# Altium footprint library разъёмы.PcbLib: 129 footprints (part 6 of 9)
Each footprint in its own frame and in the unit in brackets; x right, y up, seen from the top. Pads: shape width x height; smd on the part's side, far side on the other; paste and mask are expansions set on the pad; w line width, h text height; cw(c..) or ccw(c..) is an arc to the next point about the centre after c.
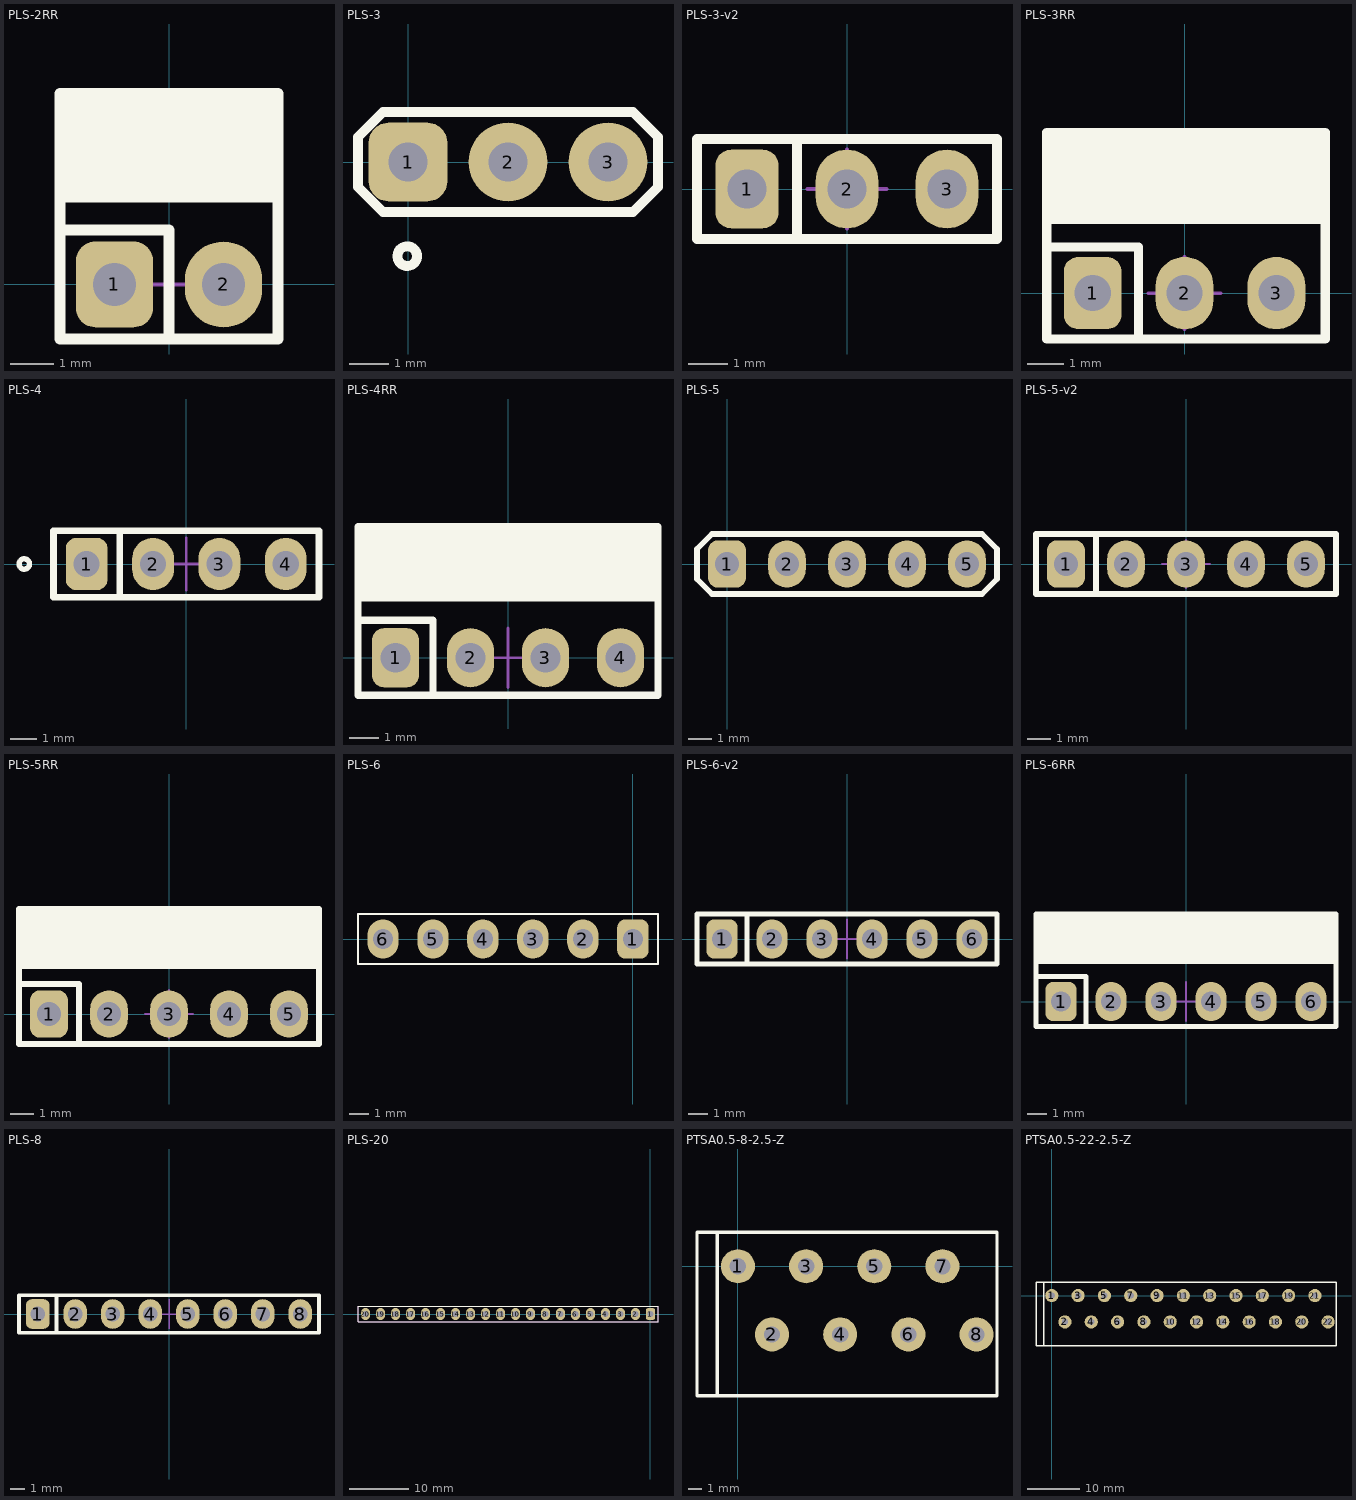
[diagram p5: the footprints below, top view; thin cyan lines are the x and y axes]

## PLS-2RR [mm]
height 10
pads (2):
  rrect50% 1.8x2 hole 1: 1(-1.27,0)
  oval 1.8x2 hole 1: 2(1.27,0)
Top Overlay:
  region: 2.54,1.905 2.54,4.445 -2.54,4.445 -2.54,1.905
  lines w0.25: -2.54,1.27 0,1.27 0,-1.27 ; -2.54,-1.27 -2.54,4.445 2.54,4.445 2.54,-1.27 -2.54,-1.27
Mechanical 15:
  lines w0.1: -1,0 1,0 ; 0,-1 0,1 ; -2.54,-1.27 2.54,-1.27 2.54,4.445 -2.54,4.445 -2.54,-1.27
3D body "User Library-Header_Male_RA_Low_2Pin.STEP": height 3.01, standoff -2.5, extent -2.54,-0.32 2.54,9.81

## PLS-3 [mm]
pads (3):
  rrect50% 2x2 hole 1: 1(0,0)
  round 2 hole 1: 2(2.54,0) 3(5.08,0)
Top Overlay:
  circle w0.25: c-0.02,-2.39 r0.25
  lines w0.254: -1.27,-0.635 -1.27,0.635 -0.635,1.27 5.715,1.27 6.35,0.635 6.35,-0.635 5.715,-1.27 -0.635,-1.27 -1.27,-0.635

## PLS-3-v2 [mm]
height 10
pads (3):
  rrect50% 1.6x2 hole 1: 1(-2.54,0)
  oval 1.6x2 hole 1: 2(0,0) 3(2.54,0)
Top Overlay:
  lines w0.25: -1.27,-1.27 -1.27,1.27 ; -3.81,-1.27 -3.81,1.27 3.81,1.27 3.81,-1.27 -3.81,-1.27
Mechanical 13:
  lines w0.1: -1.27,-1.27 -1.27,1.27 ; -3.81,-1.27 3.81,-1.27 3.81,1.27 -3.81,1.27 -3.81,-1.27
Mechanical 15:
  lines w0.1: -1,0 1,0 ; 0,-1 0,1 ; -3.81,-1.27 -3.81,1.27 3.81,1.27 3.81,-1.27 -3.81,-1.27
3D body "PLS-3.STEP": height 8.9, standoff -2.9, extent -3.81,-1.27 3.81,1.27

## PLS-3RR [mm]
height 10
pads (3):
  rrect50% 1.6x2 hole 1: 1(-2.54,0)
  oval 1.6x2 hole 1: 2(0,0) 3(2.54,0)
Top Overlay:
  region: 3.89,1.905 3.89,4.445 -3.81,4.445 -3.81,1.905
  lines w0.25: -3.81,1.27 -1.27,1.27 -1.27,-1.27 ; -3.81,-1.27 -3.81,4.445 3.89,4.445 3.89,-1.27 -3.81,-1.27
Mechanical 15:
  lines w0.1: -1,0 1,0 ; 0,-1 0,1 ; -3.81,-1.27 3.89,-1.27 3.89,4.445 -3.81,4.445 -3.81,-1.27
3D body "User Library-Header_Male_RA_Low_3Pin.STEP": height 3.01, standoff -2.5, extent -3.81,-0.32 3.81,9.81

## PLS-4 [mm]
height 10
pads (4):
  rrect50% 1.6x2 hole 1: 1(-3.81,0)
  oval 1.6x2 hole 1: 2(-1.27,0) 3(1.27,0) 4(3.81,0)
Top Overlay:
  circle w0.2: c-6.2,0 r0.2
  lines w0.25: -2.54,-1.27 -2.54,1.27 ; -5.08,-1.27 -5.08,1.27 5.08,1.27 5.08,-1.27 -5.08,-1.27
Mechanical 13:
  lines w0.1: -2.54,-1.27 -2.54,1.27 ; -5.08,-1.27 5.08,-1.27 5.08,1.27 -5.08,1.27 -5.08,-1.27
Mechanical 15:
  lines w0.1: -1,0 1,0 ; 0,-1 0,1 ; -5.08,-1.27 -5.08,1.27 5.08,1.27 5.08,-1.27 -5.08,-1.27
3D body "PLS-4.STEP": height 8.9, standoff -2.9, extent -5.08,-1.27 5.08,1.27

## PLS-4RR [mm]
height 10
pads (4):
  rrect50% 1.6x2 hole 1: 1(-3.81,0)
  oval 1.6x2 hole 1: 2(-1.27,0) 3(1.27,0) 4(3.81,0)
Top Overlay:
  region: 5.08,1.905 5.08,4.445 -5.08,4.445 -5.08,1.905
  lines w0.25: -5.08,1.27 -2.54,1.27 -2.54,-1.27 ; -5.08,-1.27 5.08,-1.27 5.08,4.445 -5.08,4.445 -5.08,-1.27
Mechanical 15:
  lines w0.1: -1,0 1,0 ; 0,-1 0,1 ; -5.08,-1.27 -5.08,4.445 5.08,4.445 5.08,-1.27 -5.08,-1.27
3D body "User Library-Header_Male_RA_Low_4Pin.STEP": height 3.01, standoff -2.5, extent -5.08,-0.32 5.08,9.81

## PLS-5 [mm]
pads (5):
  rrect50% 1.6x2 hole 1: 1(0,0)
  oval 1.6x2 hole 1: 2(2.54,0) 3(5.08,0) 4(7.62,0) 5(10.16,0)
Top Overlay:
  lines w0.254: -1.27,-0.635 -0.635,-1.27 10.795,-1.27 11.43,-0.635 11.43,0.635 10.795,1.27 -0.635,1.27 -1.27,0.635 -1.27,-0.635

## PLS-5-v2 [mm]
height 10
pads (5):
  rrect50% 1.6x2 hole 1: 1(-5.08,0)
  oval 1.6x2 hole 1: 2(-2.54,0) 3(0,0) 4(2.54,0) 5(5.08,0)
Top Overlay:
  lines w0.25: -3.81,-1.27 -3.81,1.27 ; -6.35,-1.27 -6.35,1.27 6.35,1.27 6.35,-1.27 -6.35,-1.27
Mechanical 13:
  lines w0.1: -3.81,-1.27 -3.81,1.27 ; -6.35,-1.27 6.35,-1.27 6.35,1.27 -6.35,1.27 -6.35,-1.27
Mechanical 15:
  lines w0.1: -1,0 1,0 ; 0,-1 0,1 ; -6.35,-1.27 -6.35,1.27 6.35,1.27 6.35,-1.27 -6.35,-1.27
3D body "PLS-5.STEP": height 8.9, standoff -2.9, extent -6.35,-1.27 6.35,1.27

## PLS-5RR [mm]
height 10
pads (5):
  rrect50% 1.6x2 hole 1: 1(-5.08,0)
  oval 1.6x2 hole 1: 2(-2.54,0) 3(0,0) 4(2.54,0) 5(5.08,0)
Top Overlay:
  region: 6.35,1.905 6.35,4.445 -6.35,4.445 -6.35,1.905
  lines w0.25: -6.35,1.27 -3.81,1.27 -3.81,-1.27 ; -6.35,-1.27 -6.35,4.445 6.35,4.445 6.35,-1.27 -6.35,-1.27
Mechanical 15:
  lines w0.1: -1,0 1,0 ; 0,-1 0,1 ; -6.35,-1.27 -6.35,4.445 6.35,4.445 6.35,-1.27 -6.35,-1.27
3D body "PLS-5R.STEP": height 2.94, standoff -2.55, extent -6.35,-0.32 6.35,9.9

## PLS-6 [mm]
pads (6):
  rrect50% 1.6x2 hole 1: 1(0,0)
  oval 1.6x2 hole 1: 2(-2.541,0) 3(-5.081,0) 4(-7.622,0) 5(-10.16,0) 6(-12.7,0)
Top Overlay:
  lines w0.1: -13.97,-1.27 -3.811,-1.27 1.27,-1.27 1.27,1.27 -3.811,1.27 -13.97,1.27 -13.97,-1.27
Mechanical 13:
  lines w0.1: -13.97,-1.27 1.27,-1.27 1.27,1.27 -13.97,1.27 -13.97,-1.27
  text ".Designator" at -7.525,-0.8 h1.5
3D body "Header1x2.STEP": height 8.49, standoff -2.49, extent -13.97,-1.27 -8.89,1.27
3D body "Header1x2.STEP": height 8.49, standoff -2.49, extent -8.886,-1.27 -3.806,1.27
3D body "Header1x2.STEP": height 8.49, standoff -2.49, extent -3.805,-1.27 1.275,1.27

## PLS-6-v2 [mm]
height 10
pads (6):
  rrect50% 1.6x2 hole 1: 1(-6.35,0)
  oval 1.6x2 hole 1: 2(-3.81,0) 3(-1.27,0) 4(1.27,0) 5(3.81,0) 6(6.35,0)
Top Overlay:
  lines w0.25: -5.08,-1.27 -5.08,1.27 ; -7.62,-1.27 7.62,-1.27 7.62,1.27 -7.62,1.27 -7.62,-1.27
Mechanical 13:
  lines w0.1: -5.08,-1.27 -5.08,1.27 ; -7.62,-1.27 7.62,-1.27 7.62,1.27 -7.62,1.27 -7.62,-1.27
Mechanical 15:
  lines w0.1: -1,0 1,0 ; 0,-1 0,1 ; -7.62,-1.27 7.62,-1.27 7.62,1.27 -7.62,1.27 -7.62,-1.27
3D body "PLS-6.STEP": height 8.9, standoff -2.9, extent -7.62,-1.27 7.62,1.27

## PLS-6RR [mm]
height 10
pads (6):
  rrect50% 1.6x2 hole 1: 1(-6.35,0)
  oval 1.6x2 hole 1: 2(-3.81,0) 3(-1.27,0) 4(1.27,0) 5(3.81,0) 6(6.35,0)
Top Overlay:
  region: 7.62,1.905 7.62,4.445 -7.62,4.445 -7.62,1.905
  lines w0.25: -7.62,1.27 -5.08,1.27 -5.08,-1.27 ; -7.62,-1.27 -7.62,4.445 7.62,4.445 7.62,-1.27 -7.62,-1.27
Mechanical 15:
  lines w0.1: -1,0 1,0 ; 0,-1 0,1 ; -7.62,-1.27 7.62,-1.27 7.62,4.445 -7.62,4.445 -7.62,-1.27
3D body "User Library-Header_Male_RA_Low_6Pin.STEP": height 3.01, standoff -2.5, extent -7.62,-0.32 7.62,9.81

## PLS-8 [mm]
height 10
pads (8):
  rrect50% 1.6x2 hole 1: 1(-8.89,0)
  oval 1.6x2 hole 1: 2(-6.35,0) 3(-3.81,0) 4(-1.27,0) 5(1.27,0) 6(3.81,0) 7(6.35,0) 8(8.89,0)
Top Overlay:
  lines w0.25: -7.62,-1.27 -7.62,1.27 ; -10.16,-1.27 -10.16,1.27 10.16,1.27 10.16,-1.27 -10.16,-1.27
Mechanical 13:
  lines w0.1: -7.62,-1.27 -7.62,1.27 ; -10.16,-1.27 -10.16,1.27 10.16,1.27 10.16,-1.27 -10.16,-1.27
Mechanical 15:
  lines w0.1: -1,0 1,0 ; 0,-1 0,1 ; -10.16,-1.27 -10.16,1.27 10.16,1.27 10.16,-1.27 -10.16,-1.27
3D body "User Library-1x8 TH Pitch 2_54mm_pin.sldprt": height 9.91, standoff -2.79, extent 8.555,-0.335 9.225,0.335
3D body "User Library-1x8 TH Pitch 2_54mm_holder.sldprt": height 2.92, standoff 0.12, extent -10.16,-1.27 10.16,1.27
3D body "User Library-1x8 TH Pitch 2_54mm_pin.sldprt": height 9.91, standoff -2.79, extent 6.015,-0.335 6.685,0.335
3D body "User Library-1x8 TH Pitch 2_54mm_pin.sldprt": height 9.91, standoff -2.79, extent 3.475,-0.335 4.145,0.335
3D body "User Library-1x8 TH Pitch 2_54mm_pin.sldprt": height 9.91, standoff -2.79, extent 0.935,-0.335 1.605,0.335
3D body "User Library-1x8 TH Pitch 2_54mm_pin.sldprt": height 9.91, standoff -2.79, extent -1.605,-0.335 -0.935,0.335
3D body "User Library-1x8 TH Pitch 2_54mm_pin.sldprt": height 9.91, standoff -2.79, extent -4.145,-0.335 -3.475,0.335
3D body "User Library-1x8 TH Pitch 2_54mm_pin.sldprt": height 9.91, standoff -2.79, extent -6.685,-0.335 -6.015,0.335
3D body "User Library-1x8 TH Pitch 2_54mm_pin.sldprt": height 9.91, standoff -2.79, extent -9.225,-0.335 -8.555,0.335

## PLS-20 [mm]
pads (20):
  rrect50% 1.6x2 hole 1: 1(0,0)
  oval 1.6x2 hole 1: 2(-2.54,0) 3(-5.08,0) 4(-7.62,0) 5(-10.16,0) 6(-12.7,0) 7(-15.24,0) 8(-17.78,0) 9(-20.32,0) 10(-22.86,0) 11(-25.4,0) 12(-27.94,0) 13(-30.48,0) 14(-33.02,0) 15(-35.56,0) 16(-38.1,0) 17(-40.64,0) 18(-43.18,0) 19(-45.72,0) 20(-48.26,0)
Top Overlay:
  lines w0.1: -49.53,-1.27 -49.53,1.27 -3.811,1.27 1.27,1.27 1.27,-1.27 -3.811,-1.27 -49.53,-1.27
Mechanical 13:
  lines w0.1: -49.53,-1.27 -49.53,1.27 1.27,1.27 1.27,-1.27 -49.53,-1.27
  text ".Designator" at -25.625,-0.848 h1.5
3D body "Header1x2.STEP": height 8.49, standoff -2.49, extent -49.53,-1.27 -44.45,1.27
3D body "Header1x2.STEP": height 8.49, standoff -2.49, extent -44.45,-1.27 -39.37,1.27
3D body "Header1x2.STEP": height 8.49, standoff -2.49, extent -39.37,-1.27 -34.29,1.27
3D body "Header1x2.STEP": height 8.49, standoff -2.49, extent -34.29,-1.27 -29.21,1.27
3D body "Header1x2.STEP": height 8.49, standoff -2.49, extent -29.21,-1.27 -24.13,1.27
3D body "Header1x2.STEP": height 8.49, standoff -2.49, extent -24.13,-1.27 -19.05,1.27
3D body "Header1x2.STEP": height 8.49, standoff -2.49, extent -19.05,-1.27 -13.97,1.27
3D body "Header1x2.STEP": height 8.49, standoff -2.49, extent -13.97,-1.27 -8.89,1.27
3D body "Header1x2.STEP": height 8.49, standoff -2.49, extent -3.81,-1.27 1.27,1.27
3D body "Header1x2.STEP": height 8.49, standoff -2.49, extent -8.89,-1.27 -3.81,1.27

## PTSA0.5-8-2.5-Z [mm]
pads (8):
  round 2.5 hole 1.2: 1(0,0) 2(2.5,-5) 3(5,0) 4(7.5,-5) 5(10,0) 6(12.5,-5) 7(15,0) 8(17.5,-5)
Top Overlay:
  lines w0.254: -1.5,-9.5 -1.5,2.5 ; -3,-9.5 19,-9.5 19,2.5 -3,2.5 -3,-9.5

## PTSA0.5-22-2.5-Z [mm]
pads (22):
  round 2.5 hole 1.2: 1(0,0) 2(2.5,-5) 3(5,0) 4(7.5,-5) 5(10,0) 6(12.5,-5) 7(15,0) 8(17.5,-5) 9(20,0) 10(22.5,-5) 11(25,0) 12(27.5,-5) 13(30,0) 14(32.5,-5) 15(35,0) 16(37.5,-5) 17(40,0) 18(42.5,-5) 19(45,0) 20(47.5,-5) 21(50,0) 22(52.5,-5)
Top Overlay:
  lines w0.254: -1.5,-9.5 -1.5,2.5 ; -3,-9.5 54,-9.5 54,2.5 -3,2.5 -3,-9.5